# Altium footprint library LDCN Components.PcbLib: 426 footprints (part 6 of 27)
Each footprint in its own frame and in the unit in brackets; x right, y up, seen from the top. Pads: shape width x height; smd on the part's side, far side on the other; paste and mask are expansions set on the pad; w line width, h text height; cw(c..) or ccw(c..) is an arc to the next point about the centre after c.
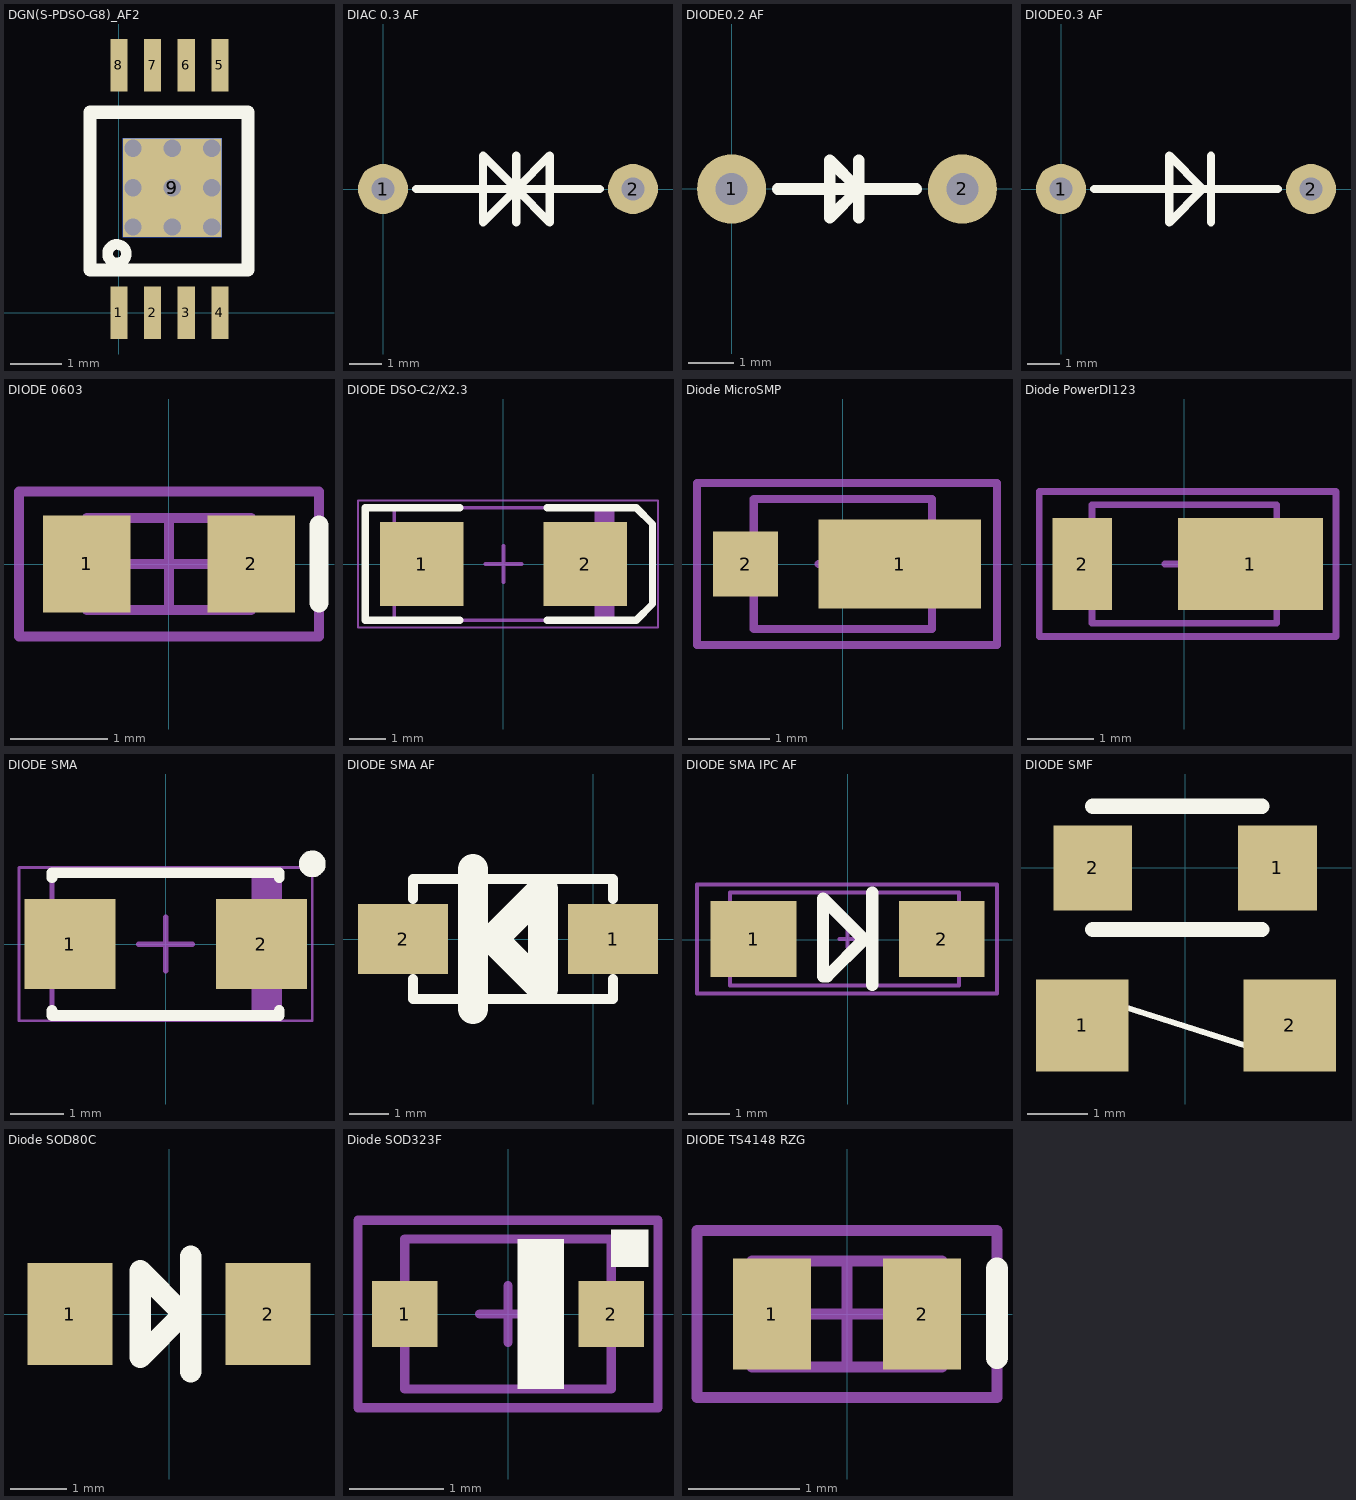
[diagram p5: the footprints below, top view; thin cyan lines are the x and y axes]

## DGN(S-PDSO-G8)_AF2 [mil] "DGN(S-PDSO-G8)_AF for THS4021"
pads (19):
  rect 13x40 smd: 1(0,0) 2(25.59,0) 3(51.18,0) 4(76.77,0) 5(76.77,188.07) 6(51.18,188.07) 7(25.59,188.07) 8(0,188.07)
  round 5 hole 13: 9(10.59,65) 9(10.59,95) 9(10.59,125) 9(40.59,65) 9(40.59,95) 9(40.59,125) 9(70.59,65) 9(70.59,95) 9(70.59,125)
  rect 75x75 smd: 9(40.59,95)
  rect 75x75 smd far side: 9(40.59,95)
Top Overlay:
  circle w8: c-1.48,44.84 r7.07
  lines w10: -21.91,32.34 -21.91,152.34 98.09,152.34 98.09,32.34 -21.91,32.34

## DIAC 0.3 AF [mil] "Suitable for DO-35"
pads (2):
  round 60 hole 27.56: 1(0,0) 2(300,0)
Top Overlay:
  lines w10: 40,0 260,0 ; 160,-40 160,40 ; 170,0 180,0 ; 160,0 120,40 120,-40 160,0 ; 160,0 200,-40 200,40 160,0

## DIODE0.2 AF [mil]
pads (2):
  round 60 hole 27.56: 1(0,0) 2(200,0)
Top Overlay:
  lines w10: 40,0 160,0 ; 110,-25 110,25 ; 85,-25 110,0 85,25 85,-25

## DIODE0.3 AF [mil] "Suitable for DO-35"
pads (2):
  round 60 hole 27.56: 1(0,0) 2(300,0)
Top Overlay:
  lines w10: 40,0 260,0 ; 180,-40 180,40 ; 180,0 170,0 ; 170,0 130,-40 130,40 170,0

## DIODE 0603 [mm] "Chip Diode 0603 package"
height 1
pads (2):
  rect 0.9x1 smd: 1(-0.85,0) 2(0.85,0)
Top Overlay:
  lines w0.2: 1.55,-0.4 1.55,0.4
Mechanical 13:
  lines w0.1: -0.85,-0.475 -0.85,0.475 0.85,0.475 0.85,-0.475 -0.85,-0.475
Mechanical 15:
  lines w0.1: -0.475,0 0.475,0 ; 0,-0.475 0,0.475 ; -1.55,-0.75 -1.55,0.75 1.55,0.75 1.55,-0.75 -1.55,-0.75
3D body: height 0.6, standoff 0, extent -0.85,-0.475 0.85,0.475

## DIODE DSO-C2/X2.3 [mm] "DO-214-AA/SMB; 2 C-Bend Leads; Body 5.3 x 3.6 mm, inc. leads (LxW)"
pads (2):
  rect 2.3x2.3 smd: 1(-2.25,0) 2(2.25,0)
Top Overlay:
  lines w0.2: -1.2,-1.55 -3.8,-1.55 -3.8,1.55 -1.2,1.55 ; 1.2,-1.55 3.65,-1.55 4.1,-1.1 4.1,1.1 3.65,1.55 1.2,1.55
Mechanical 13:
  rectangle: 2.5,-1.55 3,1.5
  lines w0.1: -3,-1.55 3,-1.55 3,1.55 -3,1.55 -3,-1.55
Mechanical 15:
  lines w0.05: -4,-1.75 4.25,-1.75 4.25,1.75 -4,1.75 -4,-1.75
  lines w0.1: -0.5,0 0.5,0 ; 0,-0.5 0,0.5

## Diode MicroSMP [mm]
pads (2):
  rect 2x1.1 smd: 1(0.7,0)
  rect 0.8x0.8 smd: 2(-1.2,0)
Mechanical 13:
  lines w0.1: -1.1,-0.8 1.1,-0.8 1.1,0.8 -1.1,0.8 -1.1,-0.8
Mechanical 15:
  lines w0.1: -0.3,0 0.3,0 ; 0,-0.3 0,0.3 ; -1.8,-1 -1.8,1 1.9,1 1.9,-1 -1.8,-1

## Diode PowerDI123 [mm]
pads (2):
  rect 2.2x1.4 smd: 1(1,0)
  rect 0.9x1.4 smd: 2(-1.55,0)
Mechanical 13:
  lines w0.1: -1.4,-0.9 -1.4,0.9 1.4,0.9 1.4,-0.9 -1.4,-0.9
Mechanical 15:
  lines w0.1: -0.3,0 0.3,0 ; 0,-0.3 0,0.3 ; -2.2,-1.1 2.3,-1.1 2.3,1.1 -2.2,1.1 -2.2,-1.1

## DIODE SMA [mm]
pads (2):
  rect 1.7x1.68 smd: 1(-1.79,0) 2(1.79,0)
Top Overlay:
  circle w0.25: c2.74,1.5 r0.125
  lines w0.2: -2.123,-1.24 -2.123,-1.332 2.123,-1.332 2.123,-1.24 ; -2.123,1.24 -2.123,1.332 2.123,1.332 2.123,1.24
Mechanical 13:
  rectangle: 1.6,-1.3 2.1,1.3
  lines w0.1: -2.122,-1.333 2.122,-1.333 2.122,1.333 -2.122,1.333 -2.122,-1.333
Mechanical 15:
  lines w0.05: -2.74,-1.432 -2.74,1.432 2.74,1.433 2.74,-1.432 -2.74,-1.433
  lines w0.1: -0.5,0 0.5,0 ; 0,-0.5 0,0.5
3D body: height 2.29, standoff 0, extent -2.122,-1.333 2.122,1.333
3D body: height -0.41, standoff -1.67, extent 1.16,-0.725 2.567,0.725
3D body: height -0.41, standoff -1.67, extent -2.567,-0.725 -1.16,0.725

## DIODE SMA AF [mil] "DIODE_SMA Similar to DO-241"
height 275.59
pads (2):
  rect 90x70 smd: 1(20,0) 2(-190,0)
Top Overlay:
  lines w10: -180,-40 -180,-60 20,-60 20,-40 ; -180,40 -180,60 20,60 20,40
  lines w30: -120,-70 -120,70 ; -100,0 -50,50 -50,-50 -100,0

## DIODE SMA IPC AF [mm] "DO-214-AC/SMA; Body 5.3 x 2.6 mm, inc. leads (LxW)"
height 4
pads (2):
  rect 2.1x1.85 smd: 1(-2.3,0.011) 2(2.3,0.011)
Top Overlay:
  lines w0.3: 0.4,0 0.4,0 ; 0.4,0 -0.6,1 -0.6,-0.9 -0.5,-0.9 0.4,0
  lines w0.305: 0.602,-1.108 0.602,1.142
Mechanical 13:
  lines w0.1: -2.873,-1.125 -2.873,1.15 2.725,1.15 2.725,-1.125 -2.873,-1.125
Mechanical 15:
  lines w0.1: -0.2,0.011 0.2,0.011 ; 0,-0.189 0,0.211 ; -3.683,-1.325 3.652,-1.325 3.652,1.35 -3.683,1.35 -3.683,-1.325
3D body: height 4, standoff 0, extent -2.9,-1.15 2.7,1.15

## DIODE SMF [mm] "DIODE SMF"
height 7
pads (4):
  rect 1.524x1.524 smd: 1(-1.7,-2.6) 2(1.729,-2.6)
  rect 1.3x1.4 smd: 1(1.524,0) 2(-1.524,0)
Top Overlay:
  lines w0.1: -2.048,-1.96 1.852,-3.204
  lines w0.254: -1.524,-1.016 1.27,-1.016 ; -1.524,1.016 1.27,1.016

## Diode SOD80C [mm]
pads (2):
  rect 1.5x1.8 smd: 1(-1.75,0) 2(1.75,0)
Top Overlay:
  lines w0.381: 0.381,-1.016 0.381,1.016 ; -0.508,-0.762 -0.508,0.762 0.254,0 -0.508,-0.762

## Diode SOD323F [mm]
pads (2):
  rect 0.7x0.7 smd: 1(-1.1,0) 2(1.1,0)
Top Overlay:
  rectangle: 1.1,0.5 1.5,0.9
  rectangle: 0.1,-0.8 0.6,0.8
Mechanical 13:
  lines w0.1: -1.1,-0.8 1.1,-0.8 1.1,0.8 -1.1,0.8 -1.1,-0.8
Mechanical 15:
  lines w0.1: -0.3,0 0.3,0 ; 0,-0.3 0,0.3 ; -1.6,-1 -1.6,1 1.6,1 1.6,-1 -1.6,-1

## diode test [mm]

## DIODE TS4148 RZG [mm] "Chip Diode 0603 package"
height 1
pads (2):
  rect 0.7x1 smd: 1(-0.675,0) 2(0.675,0)
Top Overlay:
  lines w0.2: 1.346,-0.394 1.346,0.406
Mechanical 13:
  lines w0.1: -0.85,-0.475 -0.85,0.475 0.85,0.475 0.85,-0.475 -0.85,-0.475
Mechanical 15:
  lines w0.1: -0.475,0 0.475,0 ; 0,-0.475 0,0.475 ; -1.346,-0.75 1.346,-0.75 1.346,0.75 -1.346,0.75 -1.346,-0.75
3D body: height 0.6, standoff 0, extent -0.85,-0.475 0.85,0.475